# Altium footprint library main.PcbLib: 208 footprints (part 12 of 13)
Each footprint in its own frame and in the unit in brackets; x right, y up, seen from the top. Pads: shape width x height; smd on the part's side, far side on the other; paste and mask are expansions set on the pad; w line width, h text height; cw(c..) or ccw(c..) is an arc to the next point about the centre after c.
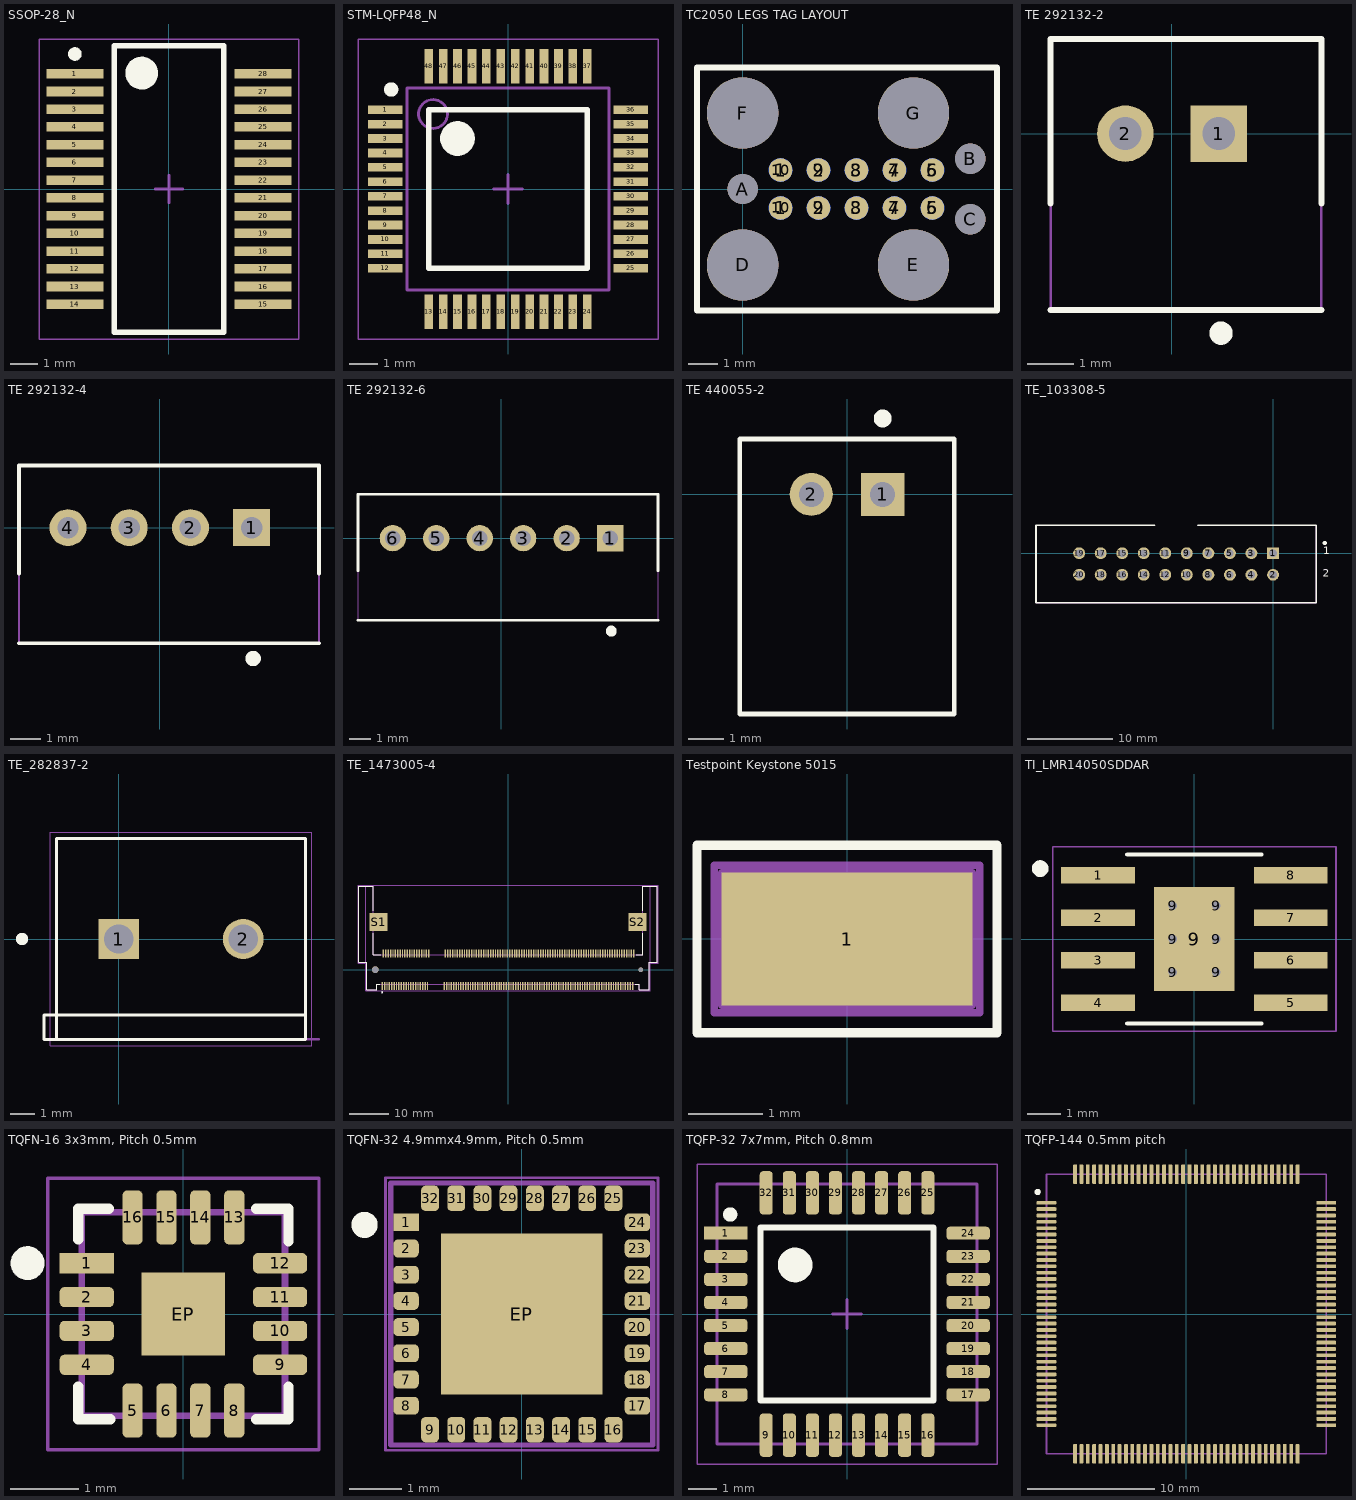
[diagram p11: the footprints below, top view; thin cyan lines are the x and y axes]

## SSOP-28_N [mm] "SOP, 28-Leads, Body 10.2x5.3mm, Pitch 0.65mm, IPC Medium Density"
height 2
pads (28):
  rect 2.1x0.35 smd: 1(-3.45,4.225) 2(-3.45,3.575) 3(-3.45,2.925) 4(-3.45,2.275) 5(-3.45,1.625) 6(-3.45,0.975) 7(-3.45,0.325) 8(-3.45,-0.325) 9(-3.45,-0.975) 10(-3.45,-1.625) 11(-3.45,-2.275) 12(-3.45,-2.925) 13(-3.45,-3.575) 14(-3.45,-4.225) 15(3.45,-4.225) 16(3.45,-3.575) 17(3.45,-2.925) 18(3.45,-2.275) 19(3.45,-1.625) 20(3.45,-0.975) 21(3.45,-0.325) 22(3.45,0.325) 23(3.45,0.975) 24(3.45,1.625) 25(3.45,2.275) 26(3.45,2.925) 27(3.45,3.575) 28(3.45,4.225)
Top Overlay:
  circle w0.25: c-3.45,4.95 r0.125
  circle w0.6: c-1,4.25 r0.3
  lines w0.2: -2,-5.25 -2,5.25 2,5.25 2,-5.25 -2,-5.25
Mechanical 7:
  text ".Designator" at -0.827,-0.953 h0.76
Mechanical 15:
  lines w0.05: -4.75,-5.5 -4.75,5.5 4.75,5.5 4.75,-5.5 -4.75,-5.5
  lines w0.1: -0.5,0 0.5,0 ; 0,-0.5 0,0.5
3D body "User Library-ssop28_model.STEP": height 1.96, standoff -0.04, extent -3.928,-5.071 3.872,5.129

## STM-LQFP48_N [mm] "QFP, 48-Leads, Body 7x7mm, Pitch 0.5mm, IPC Medium Density"
height 1.6
pads (48):
  rect 1.2x0.3 smd: 1(-4.25,2.75) 2(-4.25,2.25) 3(-4.25,1.75) 4(-4.25,1.25) 5(-4.25,0.75) 6(-4.25,0.25) 7(-4.25,-0.25) 8(-4.25,-0.75) 9(-4.25,-1.25) 10(-4.25,-1.75) 11(-4.25,-2.25) 12(-4.25,-2.75) 25(4.25,-2.75) 26(4.25,-2.25) 27(4.25,-1.75) 28(4.25,-1.25) 29(4.25,-0.75) 30(4.25,-0.25) 31(4.25,0.25) 32(4.25,0.75) 33(4.25,1.25) 34(4.25,1.75) 35(4.25,2.25) 36(4.25,2.75)
  rect 0.3x1.2 smd: 13(-2.75,-4.25) 14(-2.25,-4.25) 15(-1.75,-4.25) 16(-1.25,-4.25) 17(-0.75,-4.25) 18(-0.25,-4.25) 19(0.25,-4.25) 20(0.75,-4.25) 21(1.25,-4.25) 22(1.75,-4.25) 23(2.25,-4.25) 24(2.75,-4.25) 37(2.75,4.25) 38(2.25,4.25) 39(1.75,4.25) 40(1.25,4.25) 41(0.75,4.25) 42(0.25,4.25) 43(-0.25,4.25) 44(-0.75,4.25) 45(-1.25,4.25) 46(-1.75,4.25) 47(-2.25,4.25) 48(-2.75,4.25)
Top Overlay:
  circle w0.25: c-4.05,3.45 r0.125
  circle w0.6: c-1.75,1.75 r0.3
  lines w0.2: -2.75,-2.75 -2.75,2.75 2.75,2.75 2.75,-2.75 -2.75,-2.75
Mechanical 7:
  text ".Designator" at -2.166,-1.342 h0.76
Mechanical 13:
  circle w0.1: c-2.6,2.6 r0.5
  lines w0.1: -3.5,-3.5 -3.5,3.5 3.5,3.5 3.5,-3.5 -3.5,-3.5
Mechanical 15:
  lines w0.05: -5.2,-5.2 -5.2,5.2 5.2,5.2 5.2,-5.2 -5.2,-5.2
  lines w0.1: -0.5,0 0.5,0 ; 0,-0.5 0,0.5
3D body "User Library-LQFP48_Grid_0_5.STEP": height 1.6, standoff 0, extent -4.5,-4.5 4.5,4.5

## TC2050 LEGS TAG LAYOUT [mil]
height 1
pads (27):
  round 31 smd paste-31: 1(50,-25) 2(100,-25) 3(150,-25) 4(200,-25) 5(250,-25) 6(250,25) 7(200,25) 8(150,25) 9(100,25) 10(50,25)
  round 31 smd far side paste-31: 1(50,25) 2(100,25) 3(150,25) 4(200,25) 5(250,25) 6(250,-25) 7(200,-25) 8(150,-25) 9(100,-25) 10(50,-25)
  round 40 hole 40 unplated: A(0,0) B(300,40) C(300,-40)
  round 94 hole 94 unplated: D(0,-100) E(225,-100) F(0,100) G(225,100)
Top Overlay:
  lines w7.87: -60,-160 -60,160 335,160 335,-160 -60,-160
Mechanical 7:
  text ".Designator" at 66.93,-78.74 h30

## TE 292132-2 [mm] "TE 292132-2"
pads (2):
  rect 1.208x1.208 hole 0.7: 1(1,0)
  round 1.208 hole 0.7: 2(-1,0)
Top Overlay:
  circle w0.25: c1.05,-4.275 r0.125
  lines w0.127: -2.6,-3.775 3.2,-3.775 ; -2.6,-1.5 -2.6,2.025 3.2,2.025 3.2,-1.5
Mechanical 7:
  text ".Designator" at -4.548,-1.037 h1.52
Mechanical 15:
  lines w0.05: -2.6,-3.775 -2.6,2.025 3.2,2.025 3.2,-3.775 -2.6,-3.775
3D body "c-292132-2-b1-3d.stp": height 6.8, standoff -3.2, extent -2.6,-3.775 3.2,2.025

## TE 292132-4 [mm] "TE 292132-4"
pads (4):
  rect 1.208x1.208 hole 0.7: 1(3,0)
  round 1.208 hole 0.7: 2(1,0) 3(-1,0) 4(-3,0)
Top Overlay:
  circle w0.25: c3.05,-4.275 r0.125
  lines w0.127: -4.6,-3.775 5.2,-3.775 ; -4.6,-1.5 -4.6,2.025 5.2,2.025 5.2,-1.5
Mechanical 7:
  text ".Designator" at -2.548,-1.037 h1.52
Mechanical 15:
  lines w0.05: -4.6,-3.775 5.2,-3.775 5.2,2.025 -4.6,2.025 -4.6,-3.775
3D body "c-292132-4-b1-3d.stp": height 6.8, standoff -3.2, extent -4.6,-3.775 5.2,2.025

## TE 292132-6 [mm] "TE 292132-6"
pads (6):
  rect 1.208x1.208 hole 0.7: 1(5,0)
  round 1.208 hole 0.7: 2(3,0) 3(1,0) 4(-1,0) 5(-3,0) 6(-5,0)
Top Overlay:
  circle w0.25: c5.05,-4.275 r0.125
  lines w0.127: -6.6,-3.775 7.2,-3.775 ; -6.6,-1.5 -6.6,2.025 7.2,2.025 7.2,-1.5
Mechanical 7:
  text ".Designator" at -0.548,-1.037 h1.52
Mechanical 15:
  lines w0.05: -6.6,-3.775 -6.6,2.025 ; -2.6,-3.775 7.2,-3.775 7.2,2.025 -2.6,2.025
3D body "c-292132-6-b1-3d.stp": height 6.8, standoff -3.2, extent -6.6,-3.775 7.2,2.025

## TE 440055-2 [mm] "TE 440055-2"
pads (2):
  rect 1.208x1.208 hole 0.7: 1(1,0)
  round 1.208 hole 0.7: 2(-1,0)
Top Overlay:
  circle w0.25: c1,2.125 r0.125
  lines w0.127: 3,-6.15 -3,-6.15 -3,1.55 3,1.55 3,-6.125
Mechanical 7:
  text ".Designator" at -4.548,-1.037 h1.52
Mechanical 15:
  lines w0.05: -3,-6.15 -3,1.55 3,1.55 3,-6.15 -3,-6.15
3D body "c-440055-2-b3-3d.stp": height 5.07, standoff -3.27, extent -3,-6.15 3,1.55

## TE_103308-5 [mil]
pads (20):
  rect 55x55 hole 35: 1(0,0)
  round 55 hole 35: 2(0,-100) 3(-100,0) 4(-100,-100) 5(-200,0) 6(-200,-100) 7(-300,0) 8(-300,-100) 9(-400,0) 10(-400,-100) 11(-500,0) 12(-500,-100) 13(-600,0) 14(-600,-100) 15(-700,0) 16(-700,-100) 17(-800,0) 18(-800,-100) 19(-900,0) 20(-900,-100)
Top Overlay:
  circle w9.84: c240.16,47.24 r4.92
  lines w7.87: -550,130 -1100,130 -1100,-230 200,-230 200,130 -350,130
  text "1" at 232.28,-15.75 h60
  text "2" at 229.75,-120.7 h60
Mechanical 7:
  text ".Designator" at -596.92,-64.79 h30
Mechanical 15:
  lines w5: -350,130 200,130 ; -1100,-230 -1100,130 ; -1100,-230 -1100,130 ; -1100,-230 200,-230 ; -1100,-230 200,-230 ; -1100,130 -550,130 -1100,130 ; 200,-230 200,130 ; 200,-230 200,130
3D body "c-103308-5-l-3d.stp": height 390, standoff -118, extent -1105,-234.99 195,125.01

## TE_282837-2 [mm]
pads (2):
  rect 1.65x1.65 hole 1.2: 1(0,0)
  round 1.65 hole 1.2: 2(5.08,0)
Top Overlay:
  circle w0.25: c-3.937,0 r0.125
  lines w0.127: -3.048,-4.093 -2.486,-4.093 ; -3.048,-4.073 -3.048,-3.1 ; -3.03,-3.1 -2.522,-3.1 ; -2.54,-3.1 -2.54,-4.1 7.62,-4.1 7.62,-3.1 ; -2.54,-3.1 -2.54,4.1 7.62,4.1 7.62,-3.1 ; -2.54,-3.1 7.62,-3.1
Mechanical 5:
  lines w0.1: -2.833,-4.093 8.167,-4.093
  text "BLOCK ENTRY" at 8.367,-3.643 h1
Mechanical 7:
  text ".Designator" at 0.388,-2.051 h0.76
Mechanical 15:
  lines w0.05: -2.79,-4.35 7.87,-4.35 7.87,4.35 -2.79,4.35 -2.79,-4.35
3D body "c-282837-2-g2-3d.stp": height 9.79, standoff -3.71, extent -3.094,-4.064 7.666,4.136

## TE_1473005-4 [mm]
pads (204):
  rect 0.35x2 smd: 1(-31.65,-4.1) 2(-31.35,4.1) 3(-31.05,-4.1) 4(-30.75,4.1) 5(-30.45,-4.1) 6(-30.15,4.1) 7(-29.85,-4.1) 8(-29.55,4.1) 9(-29.25,-4.1) 10(-28.95,4.1) 11(-28.65,-4.1) 12(-28.35,4.1) 13(-28.05,-4.1) 14(-27.75,4.1) 15(-27.45,-4.1) 16(-27.15,4.1) 17(-26.85,-4.1) 18(-26.55,4.1) 19(-26.25,-4.1) 20(-25.95,4.1) 21(-25.65,-4.1) 22(-25.35,4.1) 23(-25.05,-4.1) 24(-24.75,4.1) 25(-24.45,-4.1) 26(-24.15,4.1) 27(-23.85,-4.1) 28(-23.55,4.1) 29(-23.25,-4.1) 30(-22.95,4.1) 31(-22.65,-4.1) 32(-22.35,4.1) 33(-22.05,-4.1) 34(-21.75,4.1) 35(-21.45,-4.1) 36(-21.15,4.1) 37(-20.85,-4.1) 38(-20.55,4.1) 39(-20.25,-4.1) 40(-19.95,4.1) 41(-16.05,-4.1) 42(-15.75,4.1) 43(-15.45,-4.1) 44(-15.15,4.1) 45(-14.85,-4.1) 46(-14.55,4.1) 47(-14.25,-4.1) 48(-13.95,4.1) 49(-13.65,-4.1) 50(-13.35,4.1) 51(-13.05,-4.1) 52(-12.75,4.1) 53(-12.45,-4.1) 54(-12.15,4.1) 55(-11.85,-4.1) 56(-11.55,4.1) 57(-11.25,-4.1) 58(-10.95,4.1) 59(-10.65,-4.1) 60(-10.35,4.1) 61(-10.05,-4.1) 62(-9.75,4.1) 63(-9.45,-4.1) 64(-9.15,4.1) 65(-8.85,-4.1) 66(-8.55,4.1) 67(-8.25,-4.1) 68(-7.95,4.1) 69(-7.65,-4.1) 70(-7.35,4.1) 71(-7.05,-4.1) 72(-6.75,4.1) 73(-6.45,-4.1) 74(-6.15,4.1) 75(-5.85,-4.1) 76(-5.55,4.1) 77(-5.25,-4.1) 78(-4.95,4.1) 79(-4.65,-4.1) 80(-4.35,4.1) 81(-4.05,-4.1) 82(-3.75,4.1) 83(-3.45,-4.1) 84(-3.15,4.1) 85(-2.85,-4.1) 86(-2.55,4.1) 87(-2.25,-4.1) 88(-1.95,4.1) 89(-1.65,-4.1) 90(-1.35,4.1) 91(-1.05,-4.1) 92(-0.75,4.1) 93(-0.45,-4.1) 94(-0.15,4.1) 95(0.15,-4.1) 96(0.45,4.1) 97(0.75,-4.1) 98(1.05,4.1) 99(1.35,-4.1) 100(1.65,4.1) 101(1.95,-4.1) 102(2.25,4.1) 103(2.55,-4.1) 104(2.85,4.1) 105(3.15,-4.1) 106(3.45,4.1) 107(3.75,-4.1) 108(4.05,4.1) 109(4.35,-4.1) 110(4.65,4.1) 111(4.95,-4.1) 112(5.25,4.1) 113(5.55,-4.1) 114(5.85,4.1) 115(6.15,-4.1) 116(6.45,4.1) 117(6.75,-4.1) 118(7.05,4.1) 119(7.35,-4.1) 120(7.65,4.1) 121(7.95,-4.1) 122(8.25,4.1) 123(8.55,-4.1) 124(8.85,4.1) 125(9.15,-4.1) 126(9.45,4.1) 127(9.75,-4.1) 128(10.05,4.1) 129(10.35,-4.1) 130(10.65,4.1) 131(10.95,-4.1) 132(11.25,4.1) 133(11.55,-4.1) 134(11.85,4.1) 135(12.15,-4.1) 136(12.45,4.1) 137(12.75,-4.1) 138(13.05,4.1) 139(13.35,-4.1) 140(13.65,4.1) 141(13.95,-4.1) 142(14.25,4.1) 143(14.55,-4.1) 144(14.85,4.1) 145(15.15,-4.1) 146(15.45,4.1) 147(15.75,-4.1) 148(16.05,4.1) 149(16.35,-4.1) 150(16.65,4.1) 151(16.95,-4.1) 152(17.25,4.1) 153(17.55,-4.1) 154(17.85,4.1) 155(18.15,-4.1) 156(18.45,4.1) 157(18.75,-4.1) 158(19.05,4.1) 159(19.35,-4.1) 160(19.65,4.1) 161(19.95,-4.1) 162(20.25,4.1) 163(20.55,-4.1) 164(20.85,4.1) 165(21.15,-4.1) 166(21.45,4.1) 167(21.75,-4.1) 168(22.05,4.1) 169(22.35,-4.1) 170(22.65,4.1) 171(22.95,-4.1) 172(23.25,4.1) 173(23.55,-4.1) 174(23.85,4.1) 175(24.15,-4.1) 176(24.45,4.1) 177(24.75,-4.1) 178(25.05,4.1) 179(25.35,-4.1) 180(25.65,4.1) 181(25.95,-4.1) 182(26.25,4.1) 183(26.55,-4.1) 184(26.85,4.1) 185(27.15,-4.1) 186(27.45,4.1) 187(27.75,-4.1) 188(28.05,4.1) 189(28.35,-4.1) 190(28.65,4.1) 191(28.95,-4.1) 192(29.25,4.1) 193(29.55,-4.1) 194(29.85,4.1) 195(30.15,-4.1) 196(30.45,4.1) 197(30.75,-4.1) 198(31.05,4.1) 199(31.35,-4.1) 200(31.65,4.1)
  rect 4.5x4.6 smd: S1(-32.55,12) S2(32.55,12)
  round 1.7 hole 1.7 unplated: ""(-33.4,0)
  round 1.2 hole 1.2 unplated: ""(33.4,0)
Top Overlay:
  circle w0.2: c-31.682,-5.7 r0.1
  lines w0.127: -33.95,9.2 -33.95,3.7 -32,3.7 ; -33.95,14.8 -33.95,21 -37.5,21 -37.5,1.85 -35.55,1.85 -35.55,-5 -33,-5 -33,-3.7 -32.3,-3.7 ; 32,-3.7 33,-3.7 33,-5 35.55,-5 35.55,1.85 37.5,1.85 37.5,21 33.95,21 33.95,14.8 ; 32.3,3.7 33.95,3.7 33.95,9.2
Mechanical 7:
  text ".Designator" at -3.691,8.939 h0.76
Mechanical 13:
  circle w0.2: c-31.682,-5.7 r0.1
  lines w0.127: -35.75,2 -35.75,21 ; 33.96,10 33.95,10 ; 34.02,14 33.95,14 ; 35.75,2 35.75,21 ; 33.95,10 31.65,10 31.65,14 33.95,14 ; 33.95,10 33.95,3.7 -33.95,3.7 -33.95,10 -31.65,10 -31.65,14 -33.95,14 -33.95,21 -37.5,21 -37.5,1.85 -35.55,1.85 -35.55,-5 -33,-5 -33,-3.7 33,-3.7 33,-5 35.55,-5 35.55,1.85 37.5,1.85 37.5,21 33.95,21 33.95,14
Mechanical 15:
  lines w0.05: -37.75,1.6 -35.8,1.6 -35.8,-5.35 35.8,-5.35 35.8,1.6 37.75,1.6 37.75,21.25 -37.75,21.25 -37.75,1.6
3D body "c-1473005-4-j1-3d.stp": height 5.1, standoff -0.8, extent -35.729,-4.959 35.771,21.091

## Testpoint Keystone 5015 [mm] "TEST POINT MINIATURE SMT"
pads (1):
  rect 3.4x1.8 smd: 1(0,0)
Top Overlay:
  lines w0.127: -2.032,-1.27 -2.032,1.27 2.032,1.27 2.032,-1.27 -2.032,-1.27
Mechanical 7:
  text ".Designator" at -0.919,-0.699 h1.52
Mechanical 13:
  lines w0.1: -1.7,-0.9 1.7,-0.9 1.7,0.9 -1.7,0.9 -1.7,-0.9
Mechanical 15:
  lines w0.1: -0.3,0.003 0.3,0.003 ; 0,-0.297 0,0.303 ; -1.8,-1 1.8,-1 1.8,1 -1.8,1 -1.8,-1
3D body "5015KCT-ND_TestPoint.STEP": height 1.5, standoff 0, extent -1.475,-0.492 1.475,0.508

## TI_LMR14050SDDAR [mm]
pads (15):
  rect 2.2x0.5 smd: 1(-2.875,1.905) 2(-2.875,0.635) 3(-2.875,-0.635) 4(-2.875,-1.905) 5(2.875,-1.905) 6(2.875,-0.635) 7(2.875,0.635) 8(2.875,1.905)
  round 0.559 hole 0.254: 9(-0.65,-0.995) 9(-0.65,0) 9(-0.65,0.995) 9(0.65,-0.995) 9(0.65,0) 9(0.65,0.995)
  rect 2.4x3.1 smd: 9(0,0)
Top Overlay:
  circle w0.25: c-4.6,2.1 r0.125
  lines w0.127: -2,-2.519 2,-2.519 ; -2,2.519 2,2.519
Top Paste:
  region: -1.2,1.55 1.2,1.55 1.2,-1.55 -1.2,-1.55
  region: 1.8,2.13 3.95,2.13 3.95,1.68 1.8,1.68
  region: 1.8,0.86 3.95,0.86 3.95,0.41 1.8,0.41
  region: 1.8,-0.41 3.95,-0.41 3.95,-0.86 1.8,-0.86
  region: 1.8,-1.68 3.95,-1.68 3.95,-2.13 1.8,-2.13
  region: -3.95,-1.68 -1.8,-1.68 -1.8,-2.13 -3.95,-2.13
  region: -3.95,-0.41 -1.8,-0.41 -1.8,-0.86 -3.95,-0.86
  region: -3.95,0.86 -1.8,0.86 -1.8,0.41 -3.95,0.41
  region: -3.95,2.13 -1.8,2.13 -1.8,1.68 -3.95,1.68
Top Solder:
  region: 1.705,-0.315 4.045,-0.315 4.045,-0.955 1.705,-0.955
  region: 1.705,0.955 4.045,0.955 4.045,0.315 1.705,0.315
  region: -4.045,-0.315 -1.705,-0.315 -1.705,-0.955 -4.045,-0.955
  region: -4.045,0.955 -1.705,0.955 -1.705,0.315 -4.045,0.315
  region: -4.045,-1.585 -1.705,-1.585 -1.705,-2.225 -4.045,-2.225
  region: -4.045,2.225 -1.705,2.225 -1.705,1.585 -4.045,1.585
  region: 1.705,-1.585 4.045,-1.585 4.045,-2.225 1.705,-2.225
  region: 1.705,2.225 4.045,2.225 4.045,1.585 1.705,1.585
  region: -1.2,1.55 1.2,1.55 1.2,-1.55 -1.2,-1.55
Mechanical 7:
  text ".Designator" at -3.332,-0.953 h1.52
Mechanical 15:
  lines w0.05: -4.225,-2.75 -4.225,2.75 4.225,2.75 4.225,-2.75 -4.225,-2.75
3D body "DDA0008E.stp": height 1.57, standoff 0, extent -3.048,-2.36 2.952,2.54

## TQFN-16 3x3mm, Pitch 0.5mm [mm] "TQFN-16 3x3mm, Pitch 0.5mm"
height 1
pads (17):
  rect 0.8x0.3 smd mask+0.05: 1(-1.425,0.75)
  rrect50% 0.8x0.3 smd mask+0.05: 2(-1.425,0.25) 3(-1.425,-0.25) 4(-1.425,-0.75) 9(1.425,-0.75) 10(1.425,-0.25) 11(1.425,0.25) 12(1.425,0.75)
  rrect50% 0.3x0.8 smd mask+0.05: 5(-0.75,-1.425) 6(-0.25,-1.425) 7(0.25,-1.425) 8(0.75,-1.425) 13(0.75,1.425) 14(0.25,1.425) 15(-0.25,1.425) 16(-0.75,1.425)
  rect 1.23x1.23 smd mask+0.05: EP(0,0)
Top Overlay:
  circle w0.25: c-2.3,0.75 r0.125
  lines w0.152: -1.55,-1.075 -1.55,-1.55 -1.075,-1.55 ; -1.55,1.1 -1.55,1.55 -1.1,1.55 ; 1.075,-1.55 1.55,-1.55 1.55,-1.075 ; 1.075,1.55 1.55,1.55 1.55,1.075
Mechanical 7:
  text ".Designator" at -2.166,-1.342 h0.76
Mechanical 13:
  lines w0.1: -1.5,-1.5 1.5,-1.5 1.5,1.5 -1.5,1.5 -1.5,-1.5
Mechanical 15:
  lines w0.05: -2,-2 2,-2 2,2 -2,2 -2,-2
  lines w0.1: -0.5,0 0.5,0 ; 0,-0.5 0,0.5
3D body: height 1, standoff 0, extent -1.5,-1.5 1.5,1.5

## TQFN-32 4.9mmx4.9mm, Pitch 0.5mm [mm] "TQFN-32 4.9mmx4.9mm, Pitch 0.5mm"
height 1
pads (33):
  rect 0.485x0.34 smd mask+0.05: 1(-2.207,1.75)
  rrect50% 0.485x0.34 smd mask+0.05: 2(-2.207,1.25) 3(-2.207,0.75) 4(-2.207,0.25) 5(-2.207,-0.25) 6(-2.207,-0.75) 7(-2.207,-1.25) 8(-2.207,-1.75) 17(2.207,-1.75) 18(2.207,-1.25) 19(2.207,-0.75) 20(2.207,-0.25) 21(2.207,0.25) 22(2.207,0.75) 23(2.207,1.25) 24(2.207,1.75)
  rrect50% 0.34x0.485 smd mask+0.05: 9(-1.75,-2.207) 10(-1.25,-2.207) 11(-0.75,-2.207) 12(-0.25,-2.207) 13(0.25,-2.207) 14(0.75,-2.207) 15(1.25,-2.207) 16(1.75,-2.207) 25(1.75,2.207) 26(1.25,2.207) 27(0.75,2.207) 28(0.25,2.207) 29(-0.25,2.207) 30(-0.75,2.207) 31(-1.25,2.207) 32(-1.75,2.207)
  rect 3.08x3.08 smd mask+0.05: EP(0,0)
Top Overlay:
  circle w0.25: c-3,1.7 r0.125
Mechanical 7:
  text ".Designator" at -2.2,-3.7 h0.76
Mechanical 13:
  lines w0.1: -2.5,-2.5 -2.5,-0.85 -2.5,0.65 -2.5,2.5 -0.5,2.5 2.5,2.5 2.5,-2.5 -0.5,-2.5 -2.4,-2.5 -2.5,-2.5
Mechanical 15:
  lines w0.05: -2.6,-2.6 2.6,-2.6 2.6,2.6 -2.6,2.6 -2.6,-2.6
  lines w0.1: -0.5,0 0.5,0 ; 0,-0.5 0,0.5
3D body: height 1, standoff 0, extent -2.5,-2.5 2.5,2.5

## TQFP-32 7x7mm, Pitch 0.8mm [mm] "TQFP-32 7x7mm, Pitch 0.8mm"
height 1.6
pads (32):
  rect 1.5x0.45 smd: 1(-4.2,2.8)
  rrect50% 1.5x0.45 smd: 2(-4.2,2) 3(-4.2,1.2) 4(-4.2,0.4) 5(-4.2,-0.4) 6(-4.2,-1.2) 7(-4.2,-2) 8(-4.2,-2.8) 17(4.2,-2.8) 18(4.2,-2) 19(4.2,-1.2) 20(4.2,-0.4) 21(4.2,0.4) 22(4.2,1.2) 23(4.2,2) 24(4.2,2.8)
  rrect50% 0.45x1.5 smd: 9(-2.8,-4.2) 10(-2,-4.2) 11(-1.2,-4.2) 12(-0.4,-4.2) 13(0.4,-4.2) 14(1.2,-4.2) 15(2,-4.2) 16(2.8,-4.2) 25(2.8,4.2) 26(2,4.2) 27(1.2,4.2) 28(0.4,4.2) 29(-0.4,4.2) 30(-1.2,4.2) 31(-2,4.2) 32(-2.8,4.2)
Top Overlay:
  circle w0.25: c-4.05,3.45 r0.125
  circle w0.6: c-1.8,1.7 r0.3
  lines w0.2: -3,-3 -3,3 3,3 3,-3 -3,-3
Mechanical 7:
  text ".Designator" at -2.166,-1.342 h0.76
Mechanical 13:
  circle w0.1: c-1.8,1.7 r0.5
  lines w0.1: -4.5,-4.5 -4.5,4.5 4.5,4.5 4.5,-4.5 -4.5,-4.5
Mechanical 15:
  lines w0.05: -5.2,-5.2 -5.2,5.2 5.2,5.2 5.2,-5.2 -5.2,-5.2
  lines w0.1: -0.5,0 0.5,0 ; 0,-0.5 0,0.5
3D body "User Library-TQFP32-1.STEP": height 1.1, standoff 0, extent -4.509,-4.509 4.509,4.509

## TQFP-144 0.5mm pitch [mm] "TQFP-144 0.5mm pitch"
height 1.85
pads (144):
  rrect50% 1.55x0.3 smd: 1(-11,8.75) 2(-11,8.25) 3(-11,7.75) 4(-11,7.25) 5(-11,6.75) 6(-11,6.25) 7(-11,5.75) 8(-11,5.25) 9(-11,4.75) 10(-11,4.25) 11(-11,3.75) 12(-11,3.25) 13(-11,2.75) 14(-11,2.25) 15(-11,1.75) 16(-11,1.25) 17(-11,0.75) 18(-11,0.25) 19(-11,-0.25) 20(-11,-0.75) 21(-11,-1.25) 22(-11,-1.75) 23(-11,-2.25) 24(-11,-2.75) 25(-11,-3.25) 26(-11,-3.75) 27(-11,-4.25) 28(-11,-4.75) 29(-11,-5.25) 30(-11,-5.75) 31(-11,-6.25) 32(-11,-6.75) 33(-11,-7.25) 34(-11,-7.75) 35(-11,-8.25) 36(-11,-8.75) 73(11,-8.75) 74(11,-8.25) 75(11,-7.75) 76(11,-7.25) 77(11,-6.75) 78(11,-6.25) 79(11,-5.75) 80(11,-5.25) 81(11,-4.75) 82(11,-4.25) 83(11,-3.75) 84(11,-3.25) 85(11,-2.75) 86(11,-2.25) 87(11,-1.75) 88(11,-1.25) 89(11,-0.75) 90(11,-0.25) 91(11,0.25) 92(11,0.75) 93(11,1.25) 94(11,1.75) 95(11,2.25) 96(11,2.75) 97(11,3.25) 98(11,3.75) 99(11,4.25) 100(11,4.75) 101(11,5.25) 102(11,5.75) 103(11,6.25) 104(11,6.75) 105(11,7.25) 106(11,7.75) 107(11,8.25) 108(11,8.75)
  rrect50% 0.3x1.55 smd: 37(-8.75,-11) 38(-8.25,-11) 39(-7.75,-11) 40(-7.25,-11) 41(-6.75,-11) 42(-6.25,-11) 43(-5.75,-11) 44(-5.25,-11) 45(-4.75,-11) 46(-4.25,-11) 47(-3.75,-11) 48(-3.25,-11) 49(-2.75,-11) 50(-2.25,-11) 51(-1.75,-11) 52(-1.25,-11) 53(-0.75,-11) 54(-0.25,-11) 55(0.25,-11) 56(0.75,-11) 57(1.25,-11) 58(1.75,-11) 59(2.25,-11) 60(2.75,-11) 61(3.25,-11) 62(3.75,-11) 63(4.25,-11) 64(4.75,-11) 65(5.25,-11) 66(5.75,-11) 67(6.25,-11) 68(6.75,-11) 69(7.25,-11) 70(7.75,-11) 71(8.25,-11) 72(8.75,-11) 109(8.75,11) 110(8.25,11) 111(7.75,11) 112(7.25,11) 113(6.75,11) 114(6.25,11) 115(5.75,11) 116(5.25,11) 117(4.75,11) 118(4.25,11) 119(3.75,11) 120(3.25,11) 121(2.75,11) 122(2.25,11) 123(1.75,11) 124(1.25,11) 125(0.75,11) 126(0.25,11) 127(-0.25,11) 128(-0.75,11) 129(-1.25,11) 130(-1.75,11) 131(-2.25,11) 132(-2.75,11) 133(-3.25,11) 134(-3.75,11) 135(-4.25,11) 136(-4.75,11) 137(-5.25,11) 138(-5.75,11) 139(-6.25,11) 140(-6.75,11) 141(-7.25,11) 142(-7.75,11) 143(-8.25,11) 144(-8.75,11)
Top Overlay:
  circle w0.25: c-11.7,9.6 r0.125
Mechanical 7:
  text ".Designator" at -2.848,-0.671 h1.52
Mechanical 13:
  circle w0.2: c-11.7,9.6 r0.1
  lines w0.127: -11,-11 11,-11 11,11 -11,11 -11,-11
Mechanical 15:
  lines w0.05: -11,-11 11,-11 11,11 -11,11 -11,-11
3D body "User Library-LQFP144-1.STEP": height 1.63, standoff 0.03, extent -11,-11 11,11